# Altium footprint library coral-baseboard.PcbLib: 48 footprints (part 3 of 3)
Each footprint in its own frame and in the unit in brackets; x right, y up, seen from the top. Pads: shape width x height; smd on the part's side, far side on the other; paste and mask are expansions set on the pad; w line width, h text height; cw(c..) or ccw(c..) is an arc to the next point about the centre after c.
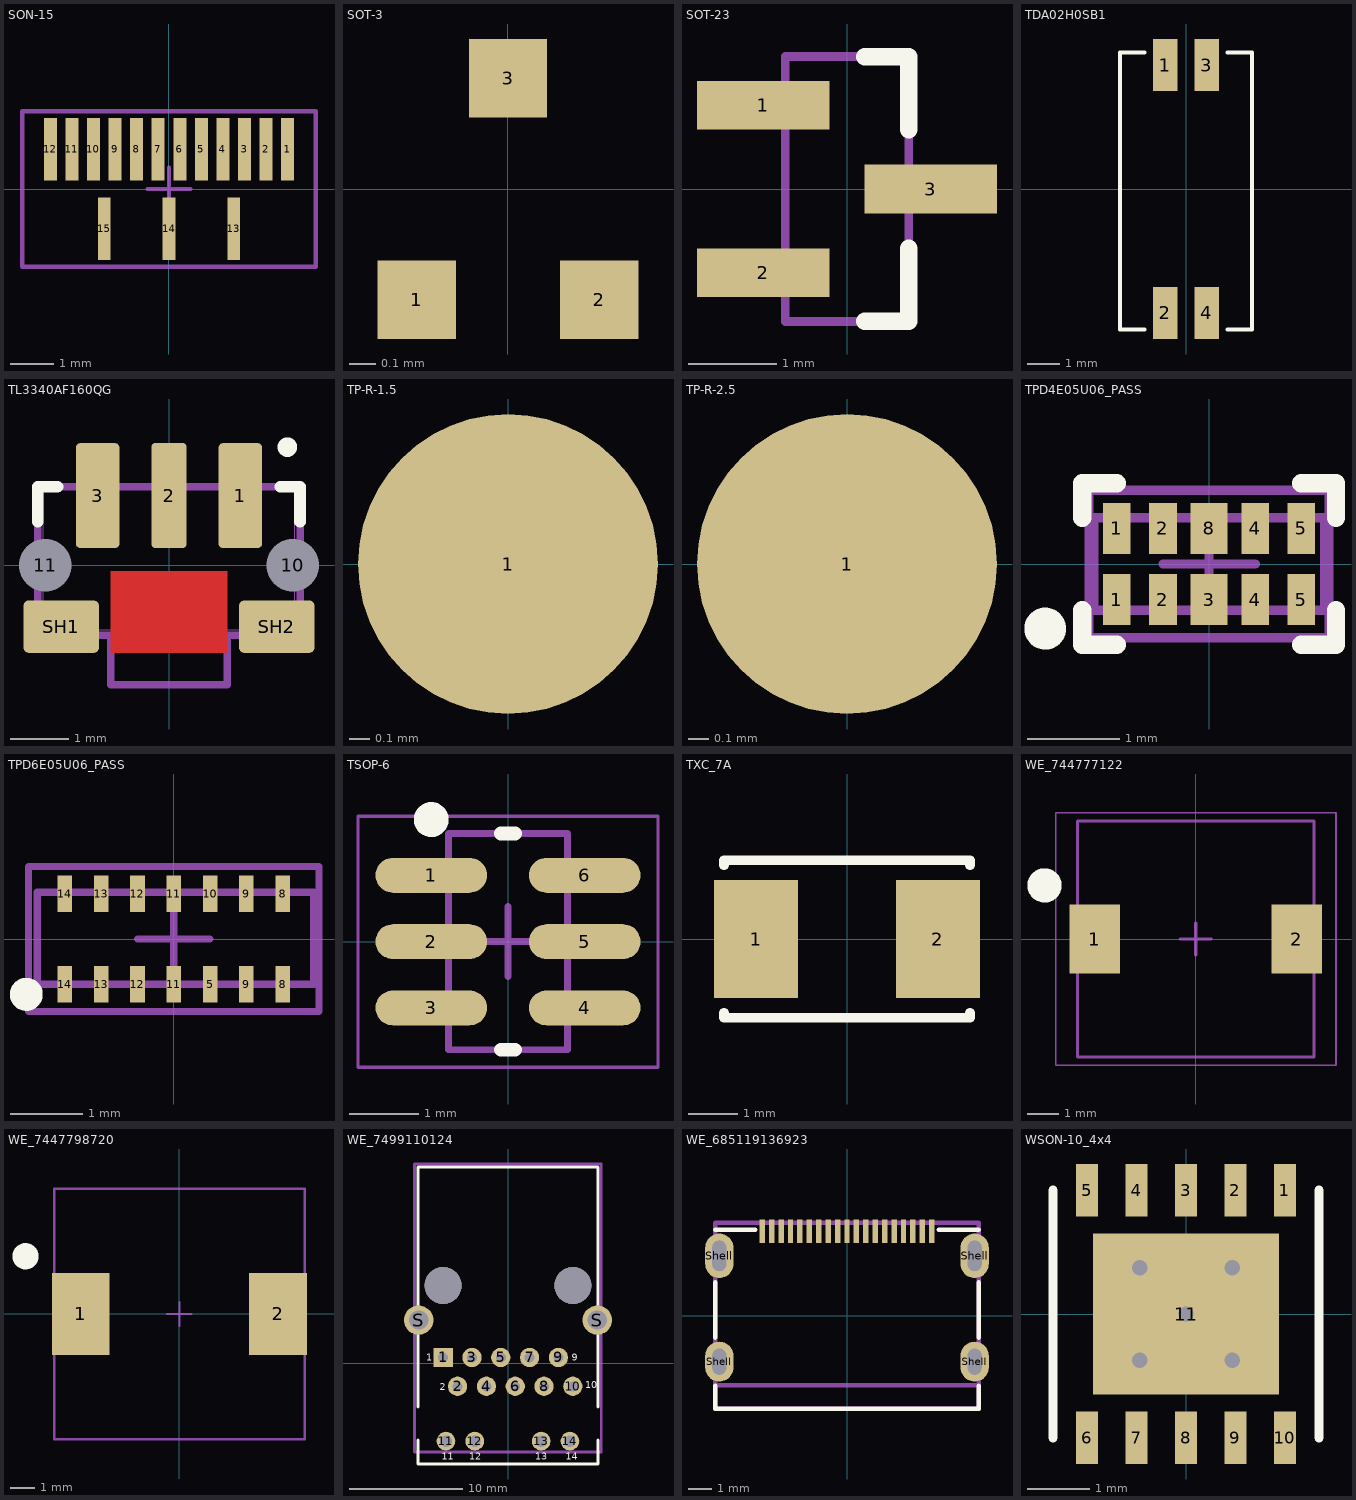
[diagram p2: the footprints below, top view; thin cyan lines are the x and y axes]

## SON-15 [mm]
height 0.8
pads (15):
  rect 0.3x1.45 smd: 1(2.75,0.925) 2(2.25,0.925) 3(1.75,0.925) 4(1.25,0.925) 5(0.75,0.925) 6(0.25,0.925) 7(-0.25,0.925) 8(-0.75,0.925) 9(-1.25,0.925) 10(-1.75,0.925) 11(-2.25,0.925) 12(-2.75,0.925) 13(1.5,-0.925) 14(0,-0.925) 15(-1.5,-0.925)
Mechanical 15:
  lines w0.1: -0.5,0 0.5,0 ; 0,-0.5 0,0.5 ; -3.4,-1.8 3.3,-1.8 3.4,-1.8 3.4,1.8 3.3,1.8 -3.3,1.8 -3.4,1.8 -3.4,-1.8
3D body: height 0.8, standoff -0.01, extent -3.3,-1.3 3.3,1.3

## SOT-3 [mm]
height 0.5
pads (3):
  rect 0.3x0.3 smd: 1(-0.35,-0.425) 2(0.35,-0.425) 3(0,0.425)
3D body: height 0.51, standoff 0, extent -0.508,-0.381 0.508,0.381

## SOT-23 [mm] "SOT23, 3-Leads, Body 2.90x2.45mm, Pitch 0.95mm, IPC Medium Density"
height 1.1
pads (3):
  rect 1.5x0.55 smd: 1(-0.95,0.95) 2(-0.95,-0.95) 3(0.95,0)
Top Overlay:
  lines w0.2: 0.2,-1.5 0.7,-1.5 0.7,-0.675 ; 0.2,1.5 0.7,1.5 0.7,0.675
Mechanical 13:
  lines w0.1: -0.7,-1.5 -0.7,1.5 0.7,1.5 0.7,-1.5 -0.7,-1.5
3D body: height 1.21, standoff -0.01, extent -1.126,-1.5 1.126,1.5

## TDA02H0SB1 [mm]
pads (4):
  rect 0.76x1.6 smd: 1(-0.635,3.81) 2(-0.635,-3.81) 3(0.635,3.81) 4(0.635,-3.81)
Top Overlay:
  lines w0.127: -1.27,-4.318 -2.032,-4.318 -2.032,-4.064 -2.032,4.191 -1.27,4.191 ; 1.27,-4.318 2.032,-4.318 2.032,-3.937 2.032,4.191 1.27,4.191
3D body: height 2.35, standoff 0, extent -1.835,-4.1 1.835,4.02

## TL3340AF160QG [mm] "SWITCH TACT SUB MINI 160GF SMD"
height 3.3
pads (7):
  rrect20% 0.75x1.8 smd: 1(1.225,1.2) 3(-1.225,1.2)
  rrect20% 0.6x1.8 smd: 2(0,1.2)
  round 0.5 hole 0.9: 10(2.125,0) 11(-2.125,0)
  rrect20% 1.3x0.9 smd: SH1(-1.85,-1.05) SH2(1.85,-1.05)
Top Layer:
  pour cut-out: -1,-0.103 -1,-1.5 1,-1.5 1,-0.103
Top Overlay:
  circle w0.254: c2.032,2.032 r0.041
  lines w0.2: -2.255,0.75 -2.255,1.35 -1.915,1.35 ; 1.91,1.35 2.25,1.35 2.25,0.75
Mechanical 2:
  lines w0.001: -2.25,-1.105 2.25,-1.105 ; -2.155,-1.2 -2.155,1.35 ; -1,-1.2 -1,-2.05 1,-2.05 1,-1.2 ; 2,-1.2 2.25,-1.2 ; 2.155,-0.42 2.25,-0.42 ; 2.155,0.42 2.25,0.42 ; 2.155,1.35 2.155,-1.2 2.25,-1.2 ; -2.25,-1.2 -2,-1.2 -2.25,-1.2 ; -2.25,-1.2 -2.25,1.35 2.25,1.35 2.25,-1.2 ; -2.25,-1.2 2.25,-1.2
Mechanical 3:
  lines w0.127: -1,-1.2 -1,-2.05 1,-2.05 1,-1.2 ; -2.25,-1.2 -2.25,1.35 2.25,1.35 2.25,-1.2 -2.25,-1.2
3D body: height 3, standoff 2.4, extent 1.402,-1.4 2,-1.2
3D body: height 3, standoff 2.4, extent -2,-1.4 -1.402,-1.2
3D body: height 2.7, standoff 0.7, extent -0.996,-2.051 0.996,-1.2
3D body: height 3.3, standoff 0, extent -2.155,-1.105 2.155,1.35
3D body: height 3.3, standoff 0, extent -2.25,-1.2 2.25,-1.105
3D body: height 3.3, standoff 0, extent -2.25,-1.105 -2.155,1.35
3D body: height 3.3, standoff 0, extent 2.155,-1.105 2.25,1.35
3D body: height 0, standoff -0.45, extent 2.155,-0.42 2.25,0.42
3D body: height 0, standoff -0.45, extent -2.25,-0.42 -2.155,0.42

## TP-R-1.5 [mm]
pads (1):
  round 1.5 smd paste-0.75: 1(0,0)

## TP-R-2.5 [mm]
pads (1):
  round 1.5 smd paste-1.25: 1(0,0)

## TPD4E05U06_PASS [mm]
pads (10):
  rect 0.3x0.55 smd: 1(-1,-0.385) 1(-1,0.385) 2(-0.5,-0.385) 2(-0.5,0.385) 4(0.5,-0.385) 4(0.5,0.385) 5(1,-0.385) 5(1,0.385)
  rect 0.4x0.55 smd: 3(0,-0.385) 8(0,0.385)
Top Overlay:
  circle w0.254: c-1.775,-0.7 r0.1
  lines w0.2: -1.375,-0.5 -1.375,-0.875 -1,-0.875 ; -1.375,0.5 -1.375,0.875 -1,0.875 ; 1,-0.875 1.375,-0.875 1.375,-0.5 ; 1,0.875 1.375,0.875 1.375,0.5
Mechanical 13:
  lines w0.1: -1.25,-0.5 -1.25,0.5 1.25,0.5 1.25,-0.5 -1.25,-0.5
Mechanical 15:
  lines w0.1: -0.5,0 0.5,0 ; 0,-0.5 0,0.5 ; -1.3,-0.8 1.3,-0.8 1.3,0.8 -1.3,0.8 -1.3,-0.8
3D body: height 0.56, standoff 0.01, extent -1.25,-0.5 1.25,0.51

## TPD6E05U06_PASS [mm]
pads (14):
  rect 0.2x0.5 smd: 5(0.5,-0.625) 8(1.5,-0.625) 8(1.5,0.625) 9(1,-0.625) 9(1,0.625) 10(0.5,0.625) 11(0,-0.625) 11(0,0.625) 12(-0.5,-0.625) 12(-0.5,0.625) 13(-1,-0.625) 13(-1,0.625) 14(-1.5,-0.625) 14(-1.5,0.625)
Top Overlay:
  circle w0.254: c-2.032,-0.762 r0.1
Mechanical 13:
  lines w0.1: -1.881,-0.625 1.929,-0.625 1.929,0.645 -1.881,0.645 -1.881,-0.625
Mechanical 15:
  lines w0.1: -0.5,0 0.5,0 ; 0,-0.5 0,0.5 ; -2,-1 -2,1 2,1 2,-1 -2,-1
3D body: height 0.6, standoff 0.01, extent -1.881,-0.625 1.929,0.645

## TSOP-6 [mm]
height 1.1
pads (6):
  oval 1.6x0.5 smd: 1(-1.1,0.95) 2(-1.1,0) 3(-1.1,-0.95) 4(1.1,-0.95) 5(1.1,0) 6(1.1,0.95)
Top Overlay:
  circle w0.25: c-1.1,1.75 r0.125
  lines w0.2: -0.1,-1.55 0.1,-1.55 ; -0.1,1.55 0.1,1.55
Mechanical 13:
  lines w0.1: -0.85,-1.55 0.85,-1.55 0.85,1.55 -0.85,1.55 -0.85,-1.55
Mechanical 15:
  lines w0.05: -2.15,-1.8 2.15,-1.8 2.15,1.8 -2.15,1.8 -2.15,-1.8
  lines w0.1: -0.5,0 0.5,0 ; 0,-0.5 0,0.5
3D body: height 1.1, standoff 0.05, extent -0.85,-1.55 0.85,1.55

## TXC_7A [mm]
height 1.2
pads (2):
  rect 1.7x2.4 smd: 1(-1.85,0) 2(1.85,0)
Top Overlay:
  lines w0.2: -2.5,-1.5 -2.5,-1.6 2.5,-1.6 2.5,-1.5 ; -2.5,1.5 -2.5,1.6 2.5,1.6 2.5,1.5
3D body: height 1.35, standoff 0, extent -2.578,-1.676 2.578,1.676

## WE_744777122 [mm]
height 4.5
pads (2):
  rect 1.6x2.2 smd: 1(-3.2,0) 2(3.2,0)
Top Overlay:
  circle w0.55: c-4.8,1.7 r0.27
Mechanical 13:
  lines w0.1: -3.75,-3.75 3.75,-3.75 3.75,3.75 -3.75,3.75 -3.75,-3.75
Mechanical 15:
  lines w0.05: -4.45,-4 4.45,-4 4.45,4 -4.45,4 -4.45,-4
  lines w0.1: -0.5,0 0.5,0 ; 0,-0.5 0,0.5
3D body: height 4.5, standoff 0, extent 3.75,3.75 3.75,3.75
3D body: height 4.5, standoff 0, extent -3.75,3.75 -3.75,3.75
3D body: height 4.25, standoff -0.25, extent -3.65,-3.65 3.65,3.65

## WE_7447798720 [mm]
height 4.5
pads (2):
  rect 2.4x3.4 smd: 1(-4.1,0) 2(4.1,0)
Top Overlay:
  circle w0.55: c-6.4,2.4 r0.27
Mechanical 13:
  lines w0.1: -5.2,-5.2 -5.2,5.2 5.2,5.2 5.2,-5.2 -5.2,-5.2
Mechanical 15:
  lines w0.05: -5.2,-5.2 -5.2,5.2 5.2,5.2 5.2,-5.2 -5.2,-5.2
  lines w0.1: -0.5,0 0.5,0 ; 0,-0.5 0,0.5
3D body: height 6.35, standoff -0.05, extent -5.1,-5.1 5.1,5.1

## WE_7499110124 [mm] "WE-RJ45 LAN Transformer, THT"
height 13.55
pads (18):
  rect 1.7x1.7 hole 0.89: 1(-5.715,0.51)
  round 1.7 hole 0.89: 2(-4.445,-2.03) 3(-3.175,0.51) 4(-1.905,-2.03) 5(-0.635,0.51) 6(0.635,-2.03) 7(1.905,0.51) 8(3.175,-2.03) 9(4.445,0.51) 10(5.715,-2.03)
  round 1.65 hole 1.02: 11(-5.469,-6.86) 12(-2.929,-6.86) 13(2.921,-6.86) 14(5.461,-6.86)
  round 2.6 hole 1.7: S(-7.878,3.81) S(7.878,3.81)
  round 3.25 hole 3.25 unplated paste+0: ""(-5.715,6.86) ""(5.715,6.86)
Top Overlay:
  lines w0.254: -7.94,-6.78 -7.94,-8.88 7.94,-8.88 7.94,-6.78 ; -7.925,-3.86 -7.925,17.3 7.925,17.3 7.925,-3.86
  text "14" at 5.08,-8.507 h0.6
  text "13" at 2.413,-8.507 h0.6
  text "12" at -3.429,-8.507 h0.6
  text "11" at -5.842,-8.507 h0.6
  text "10" at 6.8,-2.18 h0.6
  text "9" at 5.6,0.22 h0.6
  text "2" at -6,-2.38 h0.6
  text "1" at -7.2,0.22 h0.6
Mechanical 13:
  lines w0.254: -8.25,-7.83 8.225,-7.83 8.225,17.57 -8.25,17.57 -8.25,-7.83
3D body: height 13.35, standoff -3.7, extent -8.2,-7.725 8.2,17.575

## WE_685119136923 [mm] "Mini HDMI SMT Horizontal"
height 3.3
pads (23):
  rect 0.23x1 smd: 1(3.6,3.6) 2(3.2,3.6) 3(2.8,3.6) 4(2.4,3.6) 5(2,3.6) 6(1.6,3.6) 7(1.2,3.6) 8(0.8,3.6) 9(0.4,3.6) 10(0,3.6) 11(-0.4,3.6) 12(-0.8,3.6) 13(-1.2,3.6) 14(-1.6,3.6) 15(-2,3.6) 16(-2.4,3.6) 17(-2.8,3.6) 18(-3.2,3.6) 19(-3.6,3.6)
  oval 1.2x1.7 hole 0.6 slot 1.1 at 90 deg: Shell(-5.425,-1.95) Shell(5.425,-1.95)
  oval 1.2x1.9 hole 0.6 slot 1.3 at 90 deg: Shell(-5.425,2.55) Shell(5.425,2.55)
Top Overlay:
  lines w0.2: -5.6,-2.98 -5.6,-3.95 5.6,-3.95 5.6,-2.98 ; -5.6,-0.92 -5.6,1.42 ; -5.6,3.65 -3.9,3.65 ; 3.9,3.65 5.6,3.65 ; 5.6,-0.92 5.6,1.42
Mechanical 13:
  lines w0.2: -5.6,-3.95 5.6,-3.95 5.6,3.95 -5.6,3.95 -5.6,-3.95
Mechanical 15:
  lines w0.2: -5.6,-2.95 5.6,-2.95
  text "PCB Edge" at -1.794,-2.646 h0.89
3D body: height 3.29, standoff -2.16, extent -5.625,-3.95 5.625,3.952

## WSON-10_4x4 [mm] "QFN, 10-Leads, Body 4,00x4,00mm, Pitch 0,65mm, Thermal Pad 2,50x3,15mm, IPC Medium Density"
height 0.8
pads (11):
  rect 0.356x0.85 smd: 1(1.6,2) 2(0.8,2) 3(0,2) 4(-0.8,2) 5(-1.6,2) 6(-1.6,-2) 7(-0.8,-2) 8(0,-2) 9(0.8,-2) 10(1.6,-2)
  rect 3x2.6 smd: 11(0,0)
via -0.75,0.75 diameter 0.6 hole 0.25
via -0.75,-0.75 diameter 0.6 hole 0.25
via 0.75,-0.75 diameter 0.6 hole 0.25
via 0,0 diameter 0.6 hole 0.25
via 0.75,0.75 diameter 0.6 hole 0.25
Top Overlay:
  lines w0.15: -2.15,-2 -2.15,2 ; 2.15,-2 2.15,2
3D body: height 0.8, standoff 0, extent -2,-2.02 2,2.02